# Altium footprint library IoWLabsModules.PcbLib: 54 footprints (part 2 of 4)
Each footprint in its own frame and in the unit in brackets; x right, y up, seen from the top. Pads: shape width x height; smd on the part's side, far side on the other; paste and mask are expansions set on the pad; w line width, h text height; cw(c..) or ccw(c..) is an arc to the next point about the centre after c.
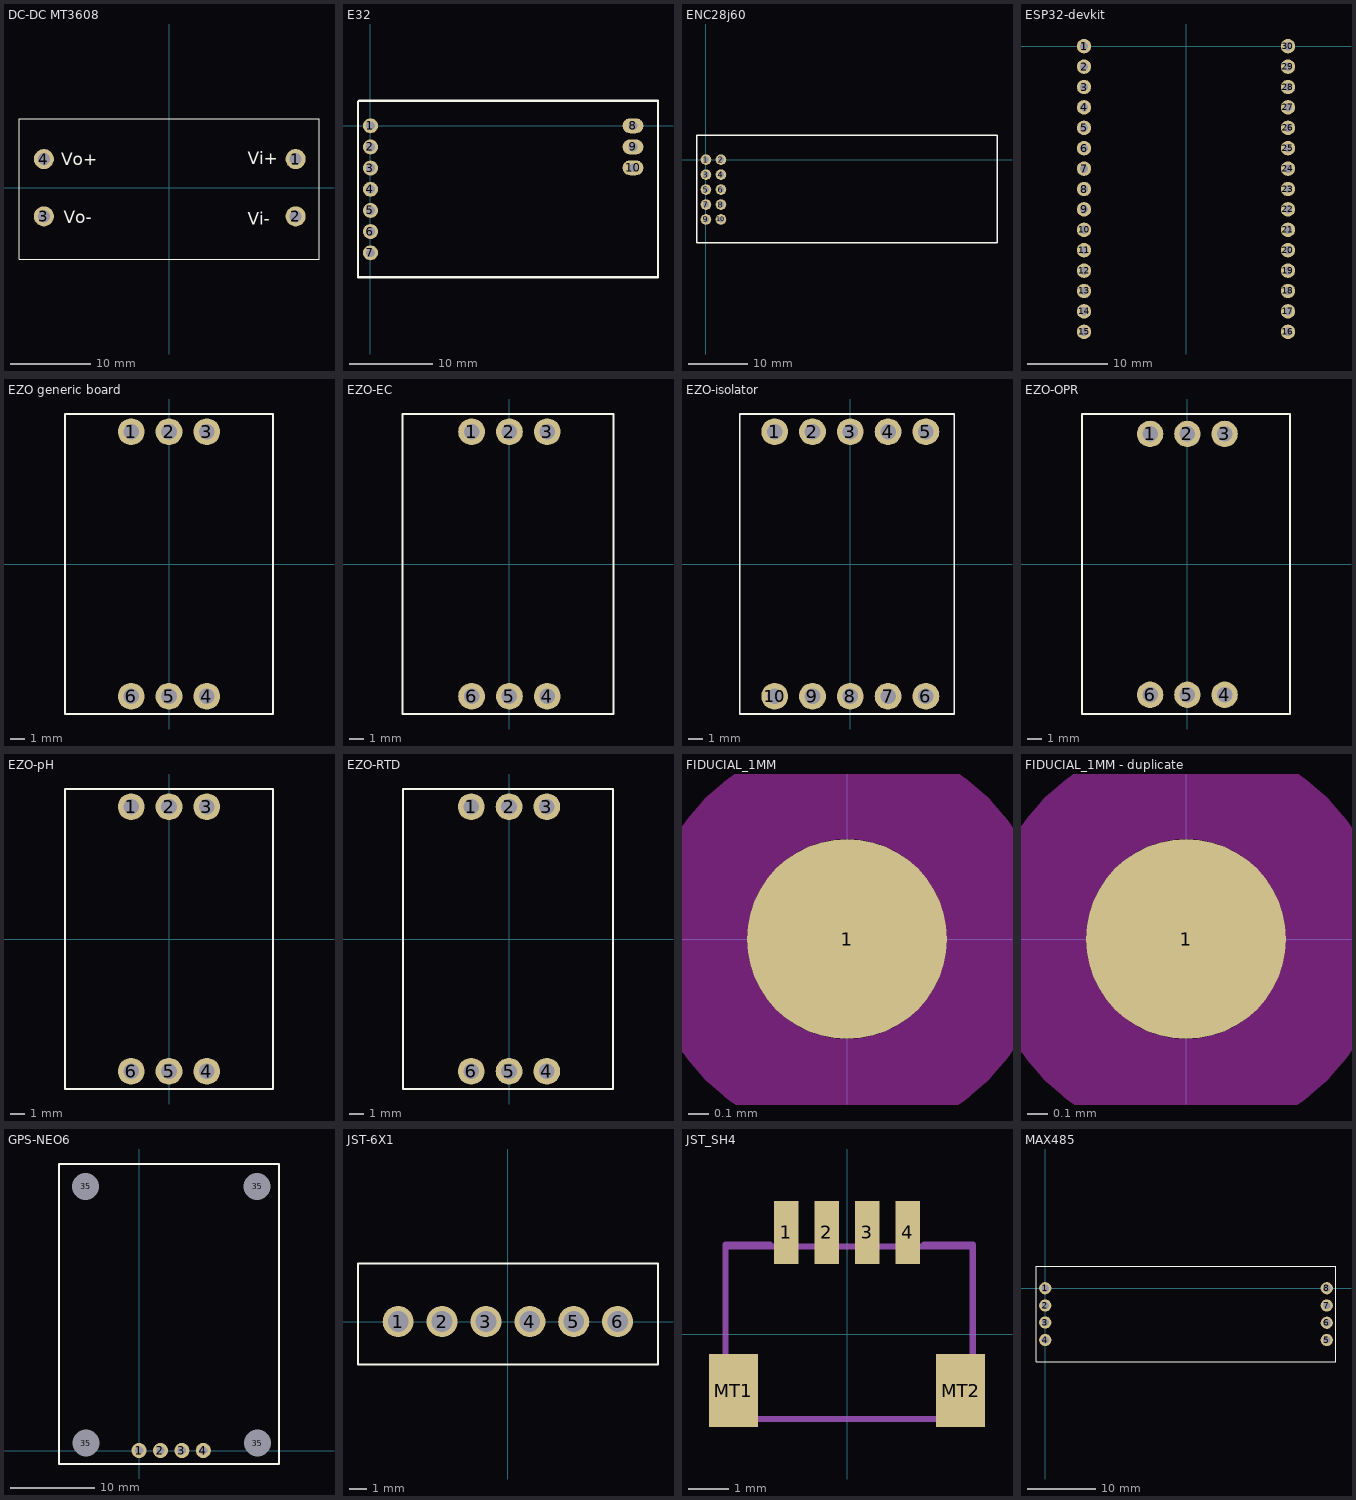
[diagram p1: the footprints below, top view; thin cyan lines are the x and y axes]

## DC-DC MT3608 [mm] "MT3608 DC-DC StepUp module"
pads (4):
  round 2.5 hole 1.5: 1(15.7,3.575) 2(15.7,-3.55) 3(-15.6,-3.55) 4(-15.6,3.575)
Top Overlay:
  lines w0.127: -18.7,-8.9 -18.7,8.6 18.6,8.6 18.6,-8.9 -18.7,-8.9
  text "Vo-" at -13.125,-4.425 h1.52
  text "Vo+" at -13.475,2.825 h1.52
  text "Vi+" at 9.725,2.9 h1.52
  text "Vi-" at 9.75,-4.575 h1.52
3D body "MT3608 Converter.STEP": height 6.45, standoff -0.85, extent -18.625,-8.875 18.525,8.55

## E32 [mm] "E32 LORA MODULE"
pads (10):
  round 1.8 hole 1.05: 1(0,0) 2(0,-2.54) 3(0,-5.08) 4(0,-7.62) 5(0,-10.16) 6(0,-12.7) 7(0,-15.24)
  oval 2.5x1.8 hole 1.05: 8(31.5,0) 9(31.5,-2.54) 10(31.5,-5.04)
Top Overlay:
  lines w0.254: -1.5,-18.175 -1.5,2.875 -1.375,3 34.5,3 34.5,-18.175 -1.5,-18.175
3D body "E32-433T20DT.stp": height 7.6, standoff -6.02, extent -1.375,-18.1 47.125,2.9

## ENC28j60 [mm] "ENC28j60 mini module"
pads (10):
  round 1.8 hole 1.05: 1(0,0) 2(2.54,0) 3(0,-2.54) 4(2.54,-2.54) 5(0,-5.08) 6(2.54,-5.08) 7(0,-7.62) 8(2.54,-7.62) 9(0,-10.16) 10(2.54,-10.16)
Top Overlay:
  lines w0.254: -1.525,-14.1 -1.525,4.1 -1.5,4.125 49.375,4.125 49.375,-14.075 49.35,-14.1 -1.525,-14.1
3D body "MNI_ENC28J60.step": height 15, standoff -2.4, extent -1.45,-14.012 49.35,4.012

## ESP32-devkit [mm]
pads (31):
  round 1.8 hole 1.05: 1(-12.7,0) 1(-12.7,0) 2(-12.7,-2.54) 3(-12.7,-5.08) 4(-12.7,-7.62) 5(-12.7,-10.16) 6(-12.7,-12.7) 7(-12.7,-15.24) 8(-12.7,-17.78) 9(-12.7,-20.32) 10(-12.7,-22.86) 11(-12.7,-25.4) 12(-12.7,-27.94) 13(-12.7,-30.48) 14(-12.7,-33.02) 15(-12.7,-35.56) 16(12.7,-35.56) 17(12.7,-33.02) 18(12.7,-30.48) 19(12.7,-27.94) 20(12.7,-25.4) 21(12.7,-22.86) 22(12.7,-20.32) 23(12.7,-17.78) 24(12.7,-15.24) 25(12.7,-12.7) 26(12.7,-10.16) 27(12.7,-7.62) 28(12.7,-5.08) 29(12.7,-2.54) 30(12.7,0)
3D body "ESP-WROOM32.STEP": height 7.1, standoff -5.3, extent -14.25,-45.505 14.25,5.425

## EZO generic board [mm] "Ezo Altas scientific generic board"
pads (6):
  round 1.8 hole 1.05: 1(-2.54,8.89) 2(0,8.89) 3(2.54,8.89) 4(2.54,-8.89) 5(0,-8.89) 6(-2.54,-8.89)
Top Overlay:
  lines w0.127: -6.985,-10.08 -6.985,10.08 6.985,10.08 6.985,-10.08 -6.985,-10.08

## EZO-EC [mm] "Ezo Altas scientific generic board"
pads (6):
  round 1.8 hole 1.05: 1(-2.54,8.89) 2(0,8.89) 3(2.54,8.89) 4(2.54,-8.89) 5(0,-8.89) 6(-2.54,-8.89)
Top Overlay:
  lines w0.127: -7.175,-10.08 6.985,-10.08 6.985,10.08 -7.175,10.08 -7.175,-10.08
3D body "EZO-EC.step": height 5.65, standoff -5.89, extent -7.125,-10.173 6.845,10.123

## EZO-isolator [mm] "Ezo Altas scientific generic board"
pads (10):
  round 1.8 hole 1.05: 1(-5.08,8.89) 2(-2.54,8.89) 3(0,8.89) 4(2.54,8.89) 5(5.08,8.89) 6(5.08,-8.89) 7(2.54,-8.89) 8(0,-8.89) 9(-2.54,-8.89) 10(-5.08,-8.89)
Top Overlay:
  lines w0.127: -7.425,-10.08 -7.425,10.08 6.985,10.08 6.985,-10.08 -7.425,-10.08
3D body "BE-IVI.step": height 6.25, standoff -6.69, extent -7.345,-10.077 6.625,10.084

## EZO-OPR [mm] "Ezo Altas scientific generic board"
pads (6):
  round 1.8 hole 1.05: 1(-2.54,8.89) 2(0,8.89) 3(2.54,8.89) 4(2.54,-8.89) 5(0,-8.89) 6(-2.54,-8.89)
Top Overlay:
  lines w0.127: -7.175,-10.2 6.985,-10.2 6.985,10.25 -7.175,10.25 -7.175,-10.2
3D body "EZO-ORP.STEP": height 5.65, standoff -5.89, extent -7.145,-10.12 6.825,10.175

## EZO-pH [mm] "Ezo Altas scientific generic board"
pads (6):
  round 1.8 hole 1.05: 1(-2.54,8.89) 2(0,8.89) 3(2.54,8.89) 4(2.54,-8.89) 5(0,-8.89) 6(-2.54,-8.89)
Top Overlay:
  lines w0.127: -6.985,-10.08 6.985,-10.08 6.985,10.08 -6.985,10.08 -6.985,-10.08
3D body "EZO-pH.step": height 5.65, standoff -5.89, extent -7.074,-10.154 6.896,10.141

## EZO-RTD [mm] "Ezo-RTD Altas scientific"
pads (6):
  round 1.8 hole 1.05: 1(-2.54,8.89) 2(0,8.89) 3(2.54,8.89) 4(2.54,-8.89) 5(0,-8.89) 6(-2.54,-8.89)
Top Overlay:
  lines w0.127: -7.125,-10.08 -7.125,10.08 6.985,10.08 6.985,-10.08 -7.125,-10.08
3D body "EZO-RTD.step": height 5.65, standoff -5.89, extent -7.149,-10.13 6.821,10.14

## FIDUCIAL_1MM [mm] "FIDUCIAL_1MM"
pads (1):
  rrect100% 1x1 smd paste-0.5: 1(0,0)
Top Layer keep-out:
  lines w0.483: -0.75,0 ccw(c0,0) 0,-0.75 ccw(c0,0) 0.75,0 ccw(c0,0) 0,0.75 ccw(c0,0) -0.75,0
Top Solder:
  lines w0.47: -0.75,0 ccw(c0,0) 0,-0.75 ccw(c0,0) 0.75,0 ccw(c0,0) 0,0.75 ccw(c0,0) -0.75,0
Keep-Out Layer:
  lines w0.5: -0.75,0 ccw(c0,0) 0,-0.75 ccw(c0,0) 0.75,0 ccw(c0,0) 0,0.75 ccw(c0,0) -0.75,0

## FIDUCIAL_1MM - duplicate [mm] "FIDUCIAL_1MM"
pads (1):
  rrect100% 1x1 smd paste-0.5: 1(0,0)
Top Layer keep-out:
  lines w0.483: -0.75,0 ccw(c0,0) 0,-0.75 ccw(c0,0) 0.75,0 ccw(c0,0) 0,0.75 ccw(c0,0) -0.75,0
Top Solder:
  lines w0.47: -0.75,0 ccw(c0,0) 0,-0.75 ccw(c0,0) 0.75,0 ccw(c0,0) 0,0.75 ccw(c0,0) -0.75,0
Keep-Out Layer:
  lines w0.5: -0.75,0 ccw(c0,0) 0,-0.75 ccw(c0,0) 0.75,0 ccw(c0,0) 0,0.75 ccw(c0,0) -0.75,0

## GPS-NEO6 [mm] "GPS MODULE"
pads (8):
  round 1.8 hole 1: 1(0,0) 2(2.54,0) 3(5.08,0) 4(7.62,0)
  round 1.524 hole 3.2: 35(-6.35,31.35) 35(-6.3,0.875) 35(14,31.35) 35(14.05,0.875)
Top Overlay:
  lines w0.2: -9.5,-1.6 -9.5,34 16.6,34 16.6,-1.6 -9.5,-1.6
3D body "GPS_ublox_board.SLDPRT": height 4.56, standoff 0.5, extent -9.49,-1.65 16.59,33.95

## JST-6X1 [mm] "JST- TH-6x1-P2.5-B3B-XH-AM-(LF)(SN)"
pads (6):
  round 1.8 hole 1.2: 1(-6.35,0) 2(-3.81,0) 3(-1.27,0) 4(1.27,0) 5(3.81,0) 6(6.35,0)
Top Overlay:
  lines w0.127: -8.675,-2.475 -8.675,3.341 -8.663,3.353 8.687,3.353 8.687,-2.463 8.675,-2.475 -8.675,-2.475
3D body "JST - XH - Thru (V) - 6Pin - 2.54mm.stp": height 7.21, standoff -3, extent -8.687,-2.489 8.687,3.353

## JST_SH4 [mm] "JST_SH4"
pads (6):
  rect 0.6x1.55 smd: 1(-1.5,2.514) 2(-0.5,2.514) 3(0.5,2.514) 4(1.5,2.514)
  rect 1.2x1.8 smd: MT1(-2.8,-1.386) MT2(2.8,-1.386)
Mechanical 2:
  lines w0.152: -3,-0.386 -3,2.214 -1.9,2.214 ; -2.1,-2.086 2.1,-2.086 ; 1.9,2.214 3.1,2.214 3.1,-0.386
Mechanical 6:
  text "JST SH 4" at -3.33,-4.006 h1.57
Mechanical 18:
  lines w0.152: -3,-2.086 -3,2.164 3.1,2.164 3.1,-2.086 -3,-2.086

## MAX485 [mm] "Module max485 to serial converter"
pads (8):
  round 1.8 hole 1.05: 1(0,0) 2(0,-2.54) 3(0,-5.04) 4(0,-7.62) 5(41.4,-7.62) 6(41.4,-5.08) 7(41.4,-2.54) 8(41.4,0)
Top Overlay:
  lines w0.127: -1.35,-10.8 -1.35,3.25 42.75,3.25 42.75,-10.825 -1.325,-10.825 -1.35,-10.8
Bottom Overlay:
  text "RO" at 4.8,-0.775 h1.52
  text "RE" at 4.8,-3.35 h1.52
  text "DE" at 4.8,-5.925 h1.52
  text "DI" at 4.8,-8.5 h1.52
  text "VCC" at 39,-0.775 h1.52
  text "B" at 39,-3.325 h1.52
  text "A" at 39,-5.875 h1.52
  text "GND" at 39,-8.425 h1.52
3D body "rs485.stp": height 14, standoff -6, extent -1.3,-10.8 42.7,3.2